# Altium footprint library cool_library.PcbLib: 1182 footprints (part 33 of 75)
Each footprint in its own frame and in the unit in brackets; x right, y up, seen from the top. Pads: shape width x height; smd on the part's side, far side on the other; paste and mask are expansions set on the pad; w line width, h text height; cw(c..) or ccw(c..) is an arc to the next point about the centre after c.
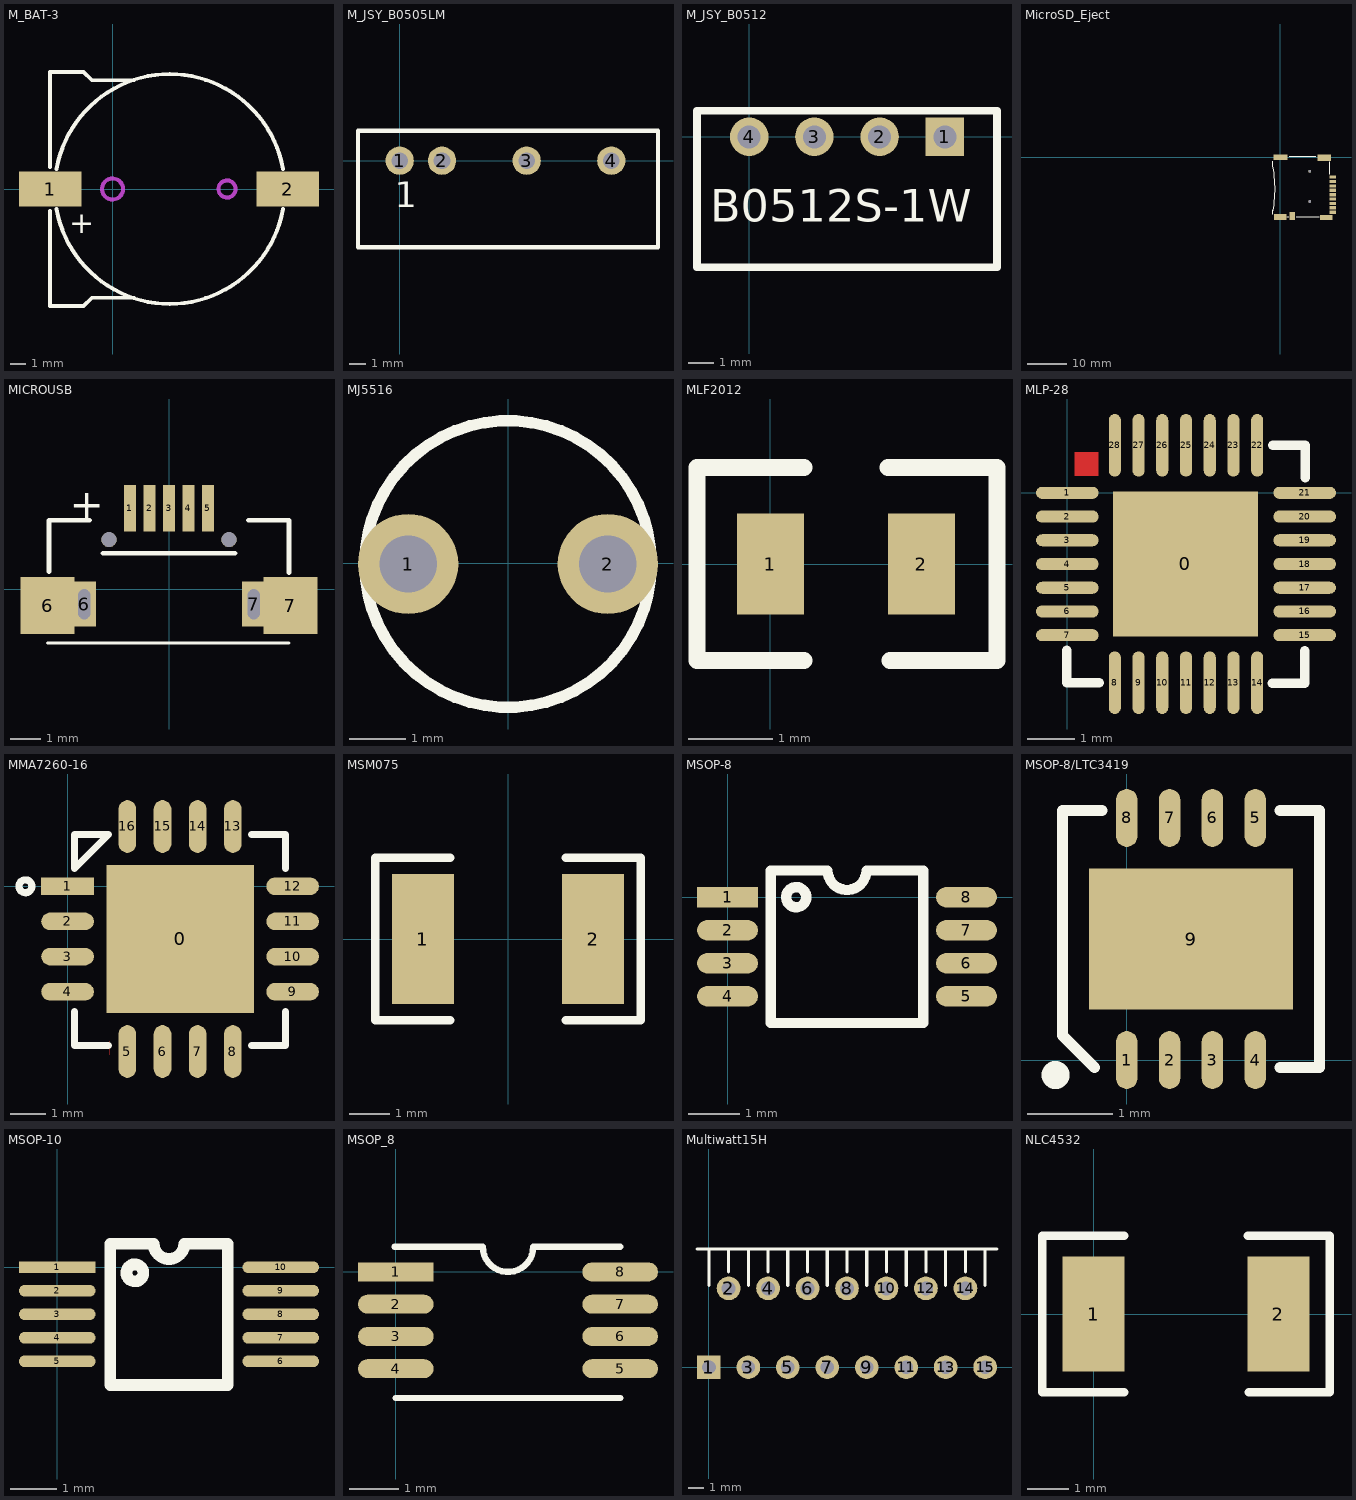
[diagram p32: the footprints below, top view; thin cyan lines are the x and y axes]

## M_BAT-3 [mil]
pads (2):
  rect 160x90 smd: 1(-160,0) 2(450,0)
Top Overlay:
  lines w10: -160,-56 -160,-300 -74,-300 -53,-279 50,-279 ; -160,56 -160,300 -74,300 -53,279 50,279 ; -143.52,-51.23 ccw(c147,0) 437.52,-51.23 ; -143.52,51.23 cw(c147,0) 437.52,51.23
  text "+" at -111,-114 h56
Keep-Out Layer:
  circle w10: c0,0 r27
  circle w10: c294,0 r22
Mechanical 1:
  circle w10: c0,0 r27
  circle w10: c294,0 r22

## M_JSY_B0505LM [mm]
pads (4):
  round 1.7 hole 1: 1(0,0) 2(2.54,0) 3(7.62,0) 4(12.7,0)
Top Overlay:
  lines w0.254: -2.5,-5.2 -2.5,1.8 15.5,1.8 15.5,-5.2 -2.5,-5.2
  text "1" at -0.3,-2.8 h1.52

## M_JSY_B0512 [mm]
pads (4):
  rect 1.5x1.5 hole 0.9: 1(7.62,0)
  round 1.5 hole 0.9: 2(5.08,0) 3(2.54,0) 4(0,0)
Top Overlay:
  lines w0.305: -2.032,-5.08 9.652,-5.08 9.652,1.016 -2.032,1.016 -2.032,-5.08
  text "B0512S-1W" at -1.524,-3.302 h1.27

## MicroSD_Eject [mm]
pads (16):
  round 0.7 hole 0.7 unplated: 0(7.417,-11.131) 0(7.417,-3.581)
  rect 1.6x0.8 smd: 1(13.217,-5.056) 2(13.217,-6.156) 3(13.217,-7.256) 4(13.217,-8.356) 5(13.217,-9.456) 6(13.217,-10.556) 7(13.217,-11.656) 8(13.217,-12.756)
  rect 1.6x0.85 smd: 9(13.217,-13.906)
  rect 1.4x1.95 smd: 10(3.017,-14.806)
  rect 3.5x1.6 smd: G1(11.067,-0.181)
  rect 3.1x1.5 smd: G2(0.067,-15.031)
  rect 3.5x1.4 smd: G3(0.067,-0.081)
  rect 3.1x1.2 smd: G4(11.567,-15.181)
Top Overlay:
  lines w0.127: -1.859,-1.046 -1.854,-1.041 -1.854,-2.311 ; -1.854,-14.376 -1.854,-13.319 ; -1.823,-13.753 ccw(c-31.271,-8.029) -1.823,-2.305 ; 1.702,-15.011 2.21,-15.011 ; 2.337,0.229 8.941,0.229 ; 3.988,-15.011 9.83,-15.011 ; 12.492,-4.381 12.492,-1.656 12.492,-1.231

## MICROUSB [mm]
pads (11):
  rect 0.4x1.55 smd: 1(-1.3,2.708) 2(-0.65,2.708) 3(0,2.708) 4(0.65,2.708) 5(1.3,2.708)
  rect 1.8x1.9 smd: 6(-4.05,-0.55) 7(4.05,-0.55)
  rect 0.8x1.5 hole 0.4 slot 1 at 90 deg: 6(-2.825,-0.5) 7(2.825,-0.5)
  round 0.5 hole 0.5 unplated: ""(-2,1.65) ""(2,1.65)
Top Overlay:
  lines w0.1: -4.05,-1.8 4,-1.8
  lines w0.152: -4,0.584 -4,2.3 -2.65,2.3 ; -2.2,1.2 2.2,1.2 ; 2.65,2.3 4,2.3 4,0.55
  text "+" at -3.3,2.35 h1
Mechanical 1:
  lines w0.127: -3.054,-1.043 -2.596,-1.043 ; -3.054,-1.043 -3.054,0.075 ; -3.054,-1.043 -3.054,0.075 ; -3.054,-1.043 -2.596,-1.043 ; -3.054,0.075 -2.596,0.075 ; -3.054,0.075 -2.596,0.075 ; -2.596,-1.043 -2.596,0.075 ; -2.596,-1.043 -2.596,0.075 ; 2.596,-1.043 3.054,-1.043 ; 2.596,-1.043 2.596,0.075 ; 2.596,-1.043 3.054,-1.043 ; 2.596,-1.043 2.596,0.075 ; 2.596,0.075 3.054,0.075 ; 2.596,0.075 3.054,0.075 ; 3.054,-1.043 3.054,0.075 ; 3.054,-1.043 3.054,0.075
3D body: height 0.25, standoff 0, extent -3.926,-2.489 3.962,2.328
3D body: height 0.1, standoff 0, extent -4.699,-1.6 -3.939,0.504
3D body: height 0.1, standoff 0, extent 3.962,-1.6 4.722,0.504

## MJ5516 [mil]
pads (2):
  round 70 hole 40: 1(-69.69,-0.35) 2(69.68,-0.35)
Top Overlay:
  circle w8: c0,-0.35 r100

## MLF2012 [mm]
pads (2):
  rect 0.8x1.2 smd: 1(0,0) 2(1.8,0)
Top Overlay:
  lines w0.203: 0.4,-1.15 -0.875,-1.15 -0.875,1.15 0.4,1.15 ; 1.4,1.15 2.7,1.15 2.7,-1.15 1.425,-1.15

## MLP-28 [mil]
pads (29):
  rect 120x120 smd: 0(98,-59)
  oval 52x10 smd: 1(0,0) 2(0,-19.68) 3(0,-39.37) 4(0,-59.05) 5(0,-78.74) 6(0,-98.42) 7(0,-118.11) 15(196.85,-118.11) 16(196.85,-98.42) 17(196.85,-78.74) 18(196.85,-59.05) 19(196.85,-39.37) 20(196.85,-19.68) 21(196.85,0)
  oval 10x52 smd: 8(39.37,-157.48) 9(59.06,-157.48) 10(78.74,-157.48) 11(98.43,-157.48) 12(118.11,-157.48) 13(137.8,-157.48) 14(157.48,-157.48) 22(157.48,39.37) 23(137.79,39.37) 24(118.11,39.37) 25(98.43,39.37) 26(78.74,39.37) 27(59.06,39.37) 28(39.37,39.37)
Top Layer:
  rectangle: 6,14 26,34
Top Overlay:
  lines w7.87: -0.63,-130.48 -0.63,-157.48 26.37,-157.48 ; 169.85,-158.11 196.85,-158.11 196.85,-131.11 ; 170.48,39.37 197.48,39.37 197.48,12.37
Top Solder:
  rectangle: 4,12 28,36

## MMA7260-16 [mm]
pads (17):
  rect 4.2x4.2 smd: 0(3.2,-1.499)
  rect 1.5x0.5 smd: 1(0,0)
  oval 1.5x0.5 smd: 2(0,-1) 3(0,-2) 4(0,-3) 9(6.4,-3) 10(6.4,-2) 11(6.4,-1) 12(6.4,0)
  oval 0.5x1.5 smd: 5(1.7,-4.7) 6(2.7,-4.7) 7(3.7,-4.7) 8(4.7,-4.7) 13(4.7,1.7) 14(3.7,1.7) 15(2.7,1.7) 16(1.7,1.7)
Top Layer:
  rectangle: 1.197,-4.799 1.197,-4.399
Top Overlay:
  circle w0.203: c-1.199,0 r0.183
  lines w0.203: 0.198,-3.562 0.198,-4.527 1.163,-4.527 ; 5.232,-4.527 6.198,-4.527 6.198,-3.562 ; 5.232,1.473 6.198,1.473 6.198,0.508 ; 0.198,0.508 1.163,1.473 0.198,1.473 0.198,0.508

## MSM075 [mm]
pads (2):
  rect 1.524x3.2 smd: 1(-2.1,0) 2(2.1,0)
Top Overlay:
  lines w0.203: -1.422,-2.007 -3.277,-2.007 -3.277,2.007 -1.422,2.007 ; 1.422,-2.007 3.277,-2.007 3.277,2.007 1.422,2.007

## MSOP-8 [mm]
pads (8):
  rect 1.2x0.4 smd: 1(0,0)
  oval 1.2x0.4 smd: 2(0,-0.65) 3(0,-1.3) 4(0,-1.95) 5(4.7,-1.95) 6(4.7,-1.3) 7(4.7,-0.65) 8(4.7,0)
Top Overlay:
  circle w0.203: c1.351,0 r0.198
  lines w0.2: 0.851,0.524 1.969,0.524 ccw(c2.35,0.524) 2.731,0.524 3.849,0.524
  lines w0.203: 0.851,0.524 0.851,-2.474 3.849,-2.474 3.849,0.524

## MSOP-8/LTC3419 [mm]
pads (9):
  oval 0.25x0.675 smd: 1(0,0) 2(0.5,0) 3(1,0) 4(1.5,0) 5(1.5,2.825) 6(1,2.825) 7(0.5,2.825) 8(0,2.825)
  rect 2.38x1.65 smd: 9(0.75,1.412)
Top Overlay:
  circle w0.254: c-0.832,-0.175 r0.036
  lines w0.127: -0.375,-0.088 -0.75,0.288 -0.75,2.912 -0.288,2.912 ; 1.788,-0.088 2.25,-0.088 2.25,2.912 1.788,2.912

## MSOP-10 [mil]
pads (10):
  rect 65x10 smd: 1(0,0)
  oval 65x10 smd: 2(0,-20) 3(0,-40) 4(0,-60) 5(0,-80) 6(190,-80) 7(190,-60) 8(190,-40) 9(190,-20) 10(190,0)
Top Overlay:
  lines w10: 66,-12 cw(c66,-4.79) 67.02,-11.93 ; 45,-100 45,20 82,20 ccw(c95,20) 108,20 145,20 145,-100 45,-100

## MSOP_8 [mil]
pads (8):
  rect 60x15 smd: 1(0,0)
  oval 60x15 smd: 2(0,-25.59) 3(0,-51.18) 4(0,-76.77) 5(178,-76.77) 6(178,-51.18) 7(178,-25.59) 8(178,0)
Top Overlay:
  lines w5: -1,20 69,20 ccw(c89,20) 109,20 ; 0,-100 178,-100 ; 110,20 178,20

## Multiwatt15H [mil] "L298"
pads (15):
  rect 60x60 hole 35: 1(0,0)
  round 60 hole 35: 2(50,200) 3(100,0) 4(150,200) 5(200,0) 6(250,200) 7(300,0) 8(350,200) 9(400,0) 10(450,200) 11(500,0) 12(550,200) 13(600,0) 14(650,200) 15(700,0)
Top Overlay:
  lines w7.87: -30,300 730,300 ; 0,207.48 0,300 ; 50,241.67 50,300 ; 100,207.48 100,300 ; 150,241.67 150,300 ; 200,207.48 200,300 ; 250,241.67 250,300 ; 300,207.48 300,300 ; 350,241.67 350,300 ; 400,207.48 400,300 ; 450,241.67 450,300 ; 500,207.48 500,300 ; 550,241.67 550,300 ; 600,207.48 600,300 ; 650,241.67 650,300 ; 700,207.48 700,300

## NLC4532 [mm]
pads (2):
  rect 1.5x2.8 smd: 1(0,0) 2(4.5,0)
Top Overlay:
  lines w0.203: 0.75,-1.9 -1.25,-1.9 -1.25,1.9 0.75,1.9 ; 3.75,1.9 5.75,1.9 5.75,-1.9 3.775,-1.9